# Altium schematic symbol library IC_Maxim.SchLib: 843 symbols (part 4 of 20)
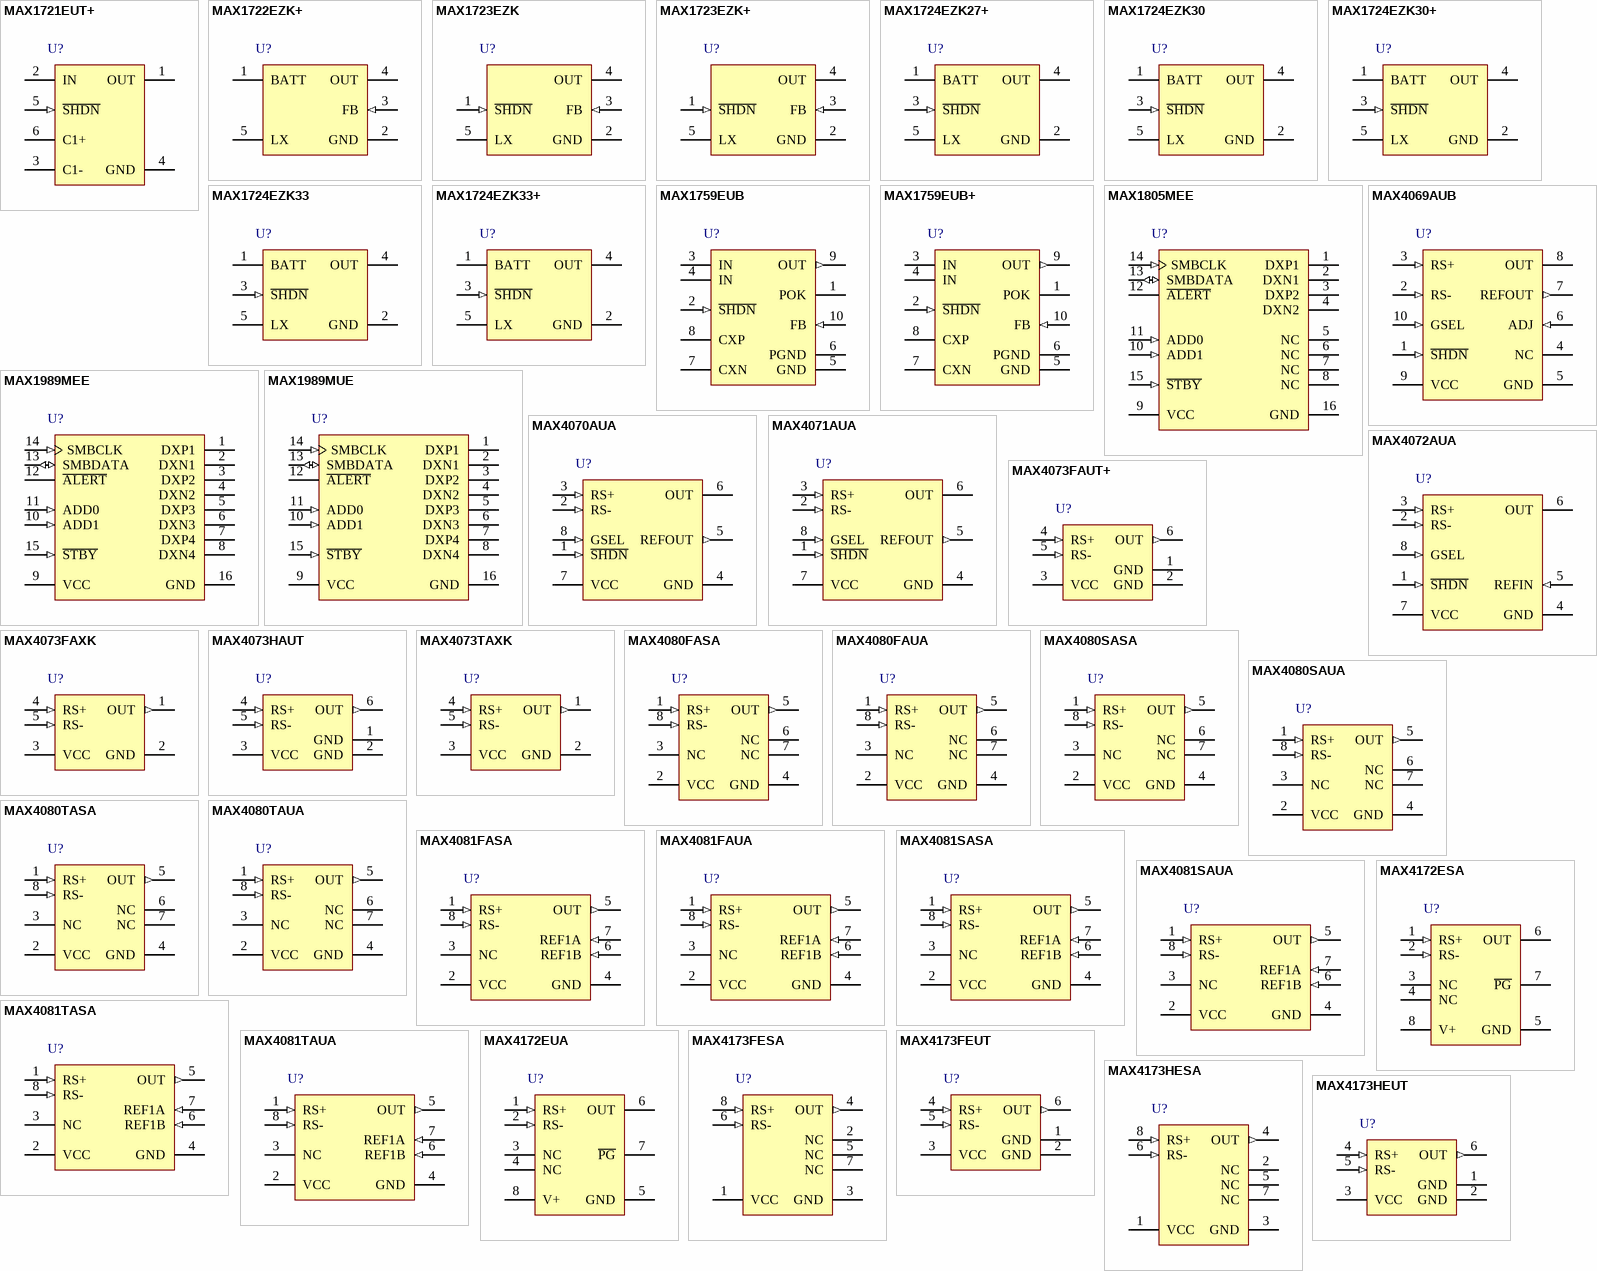
[diagram p27: symbols MAX1721EUT+ to MAX4173HEUT]

## MAX4081SASA
designator U?
76 V, High-Side, Bi-directional Current-Sense Amplifier, 60 V / V Gain, -40 to 125 degC, 8-Pin SOIC (S8-2); PartNumber: MAX4081SASA; Bi-Dir. Curr. Sense: Yes; Gain: 5 V/V, 20 V/V ,60 V/V; Industry Qualified: Automotive - AECQ100, Automotive - General; DatasheetVersion: Rev. 4; PackageVersion: Rev. D, 10/2012; PackageReference: S8-2; PackageDescription: 8-Pin Small-Outline IC, Narrow (0.15in) (S8-2), Body 4.90 x 3.90 mm, Pitch 1.27 mm; Supplier Part Number 1: N/A; Mounting Technology: Surface Mount; Code_JEDEC: MS012; ComponentLink1Description: Manufacturer URL; ComponentLink1URL: http://www.maximintegrated.com/; ComponentLink2Description: Datasheet; ComponentLink2URL: http://datasheets.maximintegrated.com/en/ds/MAX4080-MAX4081.pdf; ComponentLink3Description: Package Specification; ComponentLink3URL: http://pdfserv.maximintegrated.com/package_dwgs/21-0041.PDF
footprint SOIC8_1.27 (Footprint not found)
pins: 1 RS+ (in) "Power connection to the external-sense resistor.", 2 VCC (power) "Supply Voltage Input. Decouple VCC to GND with at least a 0.1uF capacitor to bypass line transients.", 3 NC "No Connection. No internal connection. Leave open or connect to ground.", 4 GND (power) "Ground", 5 OUT (out) "Voltage Output. For the unidirectional MAX4080, VOUT is proportional to VSENSE. For the bidirectional MAX4081, the difference voltage (VOUT - VREF) is proportional to VSENSE and indicates the correct polarity.", 6 REF1B (in) "Reference Voltage Input: Connect REF1B to REF1A or to GND (see the External Reference section).", 7 REF1A (in) "Reference Voltage Input: Connect REF1A and REF1B to a fixed reference voltage (VREF). VOUT is equal to VREF when VSENSE is zero (see the External Reference section).", 8 RS- (in) "Load connection to the external sense resistor."

## MAX4081SAUA
designator U?
76 V, High-Side, Bi-directional Current-Sense Amplifier, 60 V / V Gain, -40 to 125 degC, 8-Pin SOP (U8-1); PartNumber: MAX4081SAUA; Bi-Dir. Curr. Sense: Yes; Gain: 5 V/V, 20 V/V ,60 V/V; Industry Qualified: Automotive - AECQ100, Automotive - General; DatasheetVersion: Rev. 4; PackageVersion: Rev. L, 08/2009; PackageReference: U8-1; PackageDescription: 8-Pin Micro-MAX, Thin Shrink Small-Outline (U8-1), Body 3 x 3 mm, Pitch 0.65mm; Supplier Part Number 1: N/A; Mounting Technology: Surface Mount; Code_JEDEC: MO-187; ComponentLink1Description: Manufacturer URL; ComponentLink1URL: http://www.maximintegrated.com/; ComponentLink2Description: Datasheet; ComponentLink2URL: http://datasheets.maximintegrated.com/en/ds/MAX4080-MAX4081.pdf; ComponentLink3Description: Package Specification; ComponentLink3URL: http://pdfserv.maximintegrated.com/package_dwgs/21-0036.PDF
footprint VSSOP8_0.65 (Footprint not found)
pins: 1 RS+ (in) "Power connection to the external-sense resistor.", 2 VCC (power) "Supply Voltage Input. Decouple VCC to GND with at least a 0.1uF capacitor to bypass line transients.", 3 NC "No Connection. No internal connection. Leave open or connect to ground.", 4 GND (power) "Ground", 5 OUT (out) "Voltage Output. For the unidirectional MAX4080, VOUT is proportional to VSENSE. For the bidirectional MAX4081, the difference voltage (VOUT - VREF) is proportional to VSENSE and indicates the correct polarity.", 6 REF1B (in) "Reference Voltage Input: Connect REF1B to REF1A or to GND (see the External Reference section).", 7 REF1A (in) "Reference Voltage Input: Connect REF1A and REF1B to a fixed reference voltage (VREF). VOUT is equal to VREF when VSENSE is zero (see the External Reference section).", 8 RS- (in) "Load connection to the external sense resistor."

## MAX4081TASA
designator U?
76 V, High-Side, Bi-directional Current-Sense Amplifier, 20 V / V Gain, -40 to 125 degC, 8-Pin SOIC (S8-2); PartNumber: MAX4081TASA; Bi-Dir. Curr. Sense: Yes; Gain: 5 V/V, 20 V/V ,60 V/V; Industry Qualified: Automotive - AECQ100, Automotive - General; DatasheetVersion: Rev. 4; PackageVersion: Rev. D, 10/2012; PackageReference: S8-2; PackageDescription: 8-Pin Small-Outline IC, Narrow (0.15in) (S8-2), Body 4.90 x 3.90 mm, Pitch 1.27 mm; Supplier Part Number 1: N/A; Mounting Technology: Surface Mount; Code_JEDEC: MS012; ComponentLink1Description: Manufacturer URL; ComponentLink1URL: http://www.maximintegrated.com/; ComponentLink2Description: Datasheet; ComponentLink2URL: http://datasheets.maximintegrated.com/en/ds/MAX4080-MAX4081.pdf; ComponentLink3Description: Package Specification; ComponentLink3URL: http://pdfserv.maximintegrated.com/package_dwgs/21-0041.PDF
footprint SOIC8_1.27 (Footprint not found)
pins: 1 RS+ (in) "Power connection to the external-sense resistor.", 2 VCC (power) "Supply Voltage Input. Decouple VCC to GND with at least a 0.1uF capacitor to bypass line transients.", 3 NC "No Connection. No internal connection. Leave open or connect to ground.", 4 GND (power) "Ground", 5 OUT (out) "Voltage Output. For the unidirectional MAX4080, VOUT is proportional to VSENSE. For the bidirectional MAX4081, the difference voltage (VOUT - VREF) is proportional to VSENSE and indicates the correct polarity.", 6 REF1B (in) "Reference Voltage Input: Connect REF1B to REF1A or to GND (see the External Reference section).", 7 REF1A (in) "Reference Voltage Input: Connect REF1A and REF1B to a fixed reference voltage (VREF). VOUT is equal to VREF when VSENSE is zero (see the External Reference section).", 8 RS- (in) "Load connection to the external sense resistor."

## MAX4081TAUA
designator U?
76 V, High-Side, Bi-directional Current-Sense Amplifier, 20 V / V Gain, -40 to 125 degC, 8-Pin SOP (U8-1); PartNumber: MAX4081TAUA; Bi-Dir. Curr. Sense: Yes; Gain: 5 V/V, 20 V/V ,60 V/V; Industry Qualified: Automotive - AECQ100, Automotive - General; DatasheetVersion: Rev. 4; PackageVersion: Rev. L, 08/2009; PackageReference: U8-1; PackageDescription: 8-Pin Micro-MAX, Thin Shrink Small-Outline (U8-1), Body 3 x 3 mm, Pitch 0.65mm; Supplier Part Number 1: MAX4081TAUA-ND; Supplier Part Number 2: 700-MAX4081TAUA-NR; Mounting Technology: Surface Mount; Code_JEDEC: MO-187; ComponentLink1Description: Manufacturer URL; ComponentLink1URL: http://www.maximintegrated.com/; ComponentLink2Description: Datasheet; ComponentLink2URL: http://datasheets.maximintegrated.com/en/ds/MAX4080-MAX4081.pdf; ComponentLink3Description: Package Specification; ComponentLink3URL: http://pdfserv.maximintegrated.com/package_dwgs/21-0036.PDF
footprint VSSOP8_0.65 (Footprint not found)
pins: 1 RS+ (in) "Power connection to the external-sense resistor.", 2 VCC (power) "Supply Voltage Input. Decouple VCC to GND with at least a 0.1uF capacitor to bypass line transients.", 3 NC "No Connection. No internal connection. Leave open or connect to ground.", 4 GND (power) "Ground", 5 OUT (out) "Voltage Output. For the unidirectional MAX4080, VOUT is proportional to VSENSE. For the bidirectional MAX4081, the difference voltage (VOUT - VREF) is proportional to VSENSE and indicates the correct polarity.", 6 REF1B (in) "Reference Voltage Input: Connect REF1B to REF1A or to GND (see the External Reference section).", 7 REF1A (in) "Reference Voltage Input: Connect REF1A and REF1B to a fixed reference voltage (VREF). VOUT is equal to VREF when VSENSE is zero (see the External Reference section).", 8 RS- (in) "Load connection to the external sense resistor."

## MAX4172ESA
designator U?
Precision, High-Side, Current-Sense Amplifier (Iout) 10 uA / mV Gain, -40 to 85 degC, 8-Pin SOIC (S8-4); PartNumber: MAX4172ESA; Bi-Dir. Curr. Sense: No; DatasheetVersion: Rev. 2; PackageVersion: Rev. D, 10/2012; PackageReference: S8-4; PackageDescription: 8-Pin Small-Outline IC, Narrow, Body 3.9 x 4.9 mm, Pitch 1.27 mm; Supplier Part Number 1: MAX4172ESA-ND; Supplier Part Number 2: 700-MAX4172ESA-NR; Gain: 10 uA/mV; Mounting Technology: Surface Mount; Code_JEDEC: MS-012; ComponentLink1Description: Manufacturer URL; ComponentLink1URL: http://www.maximintegrated.com/; ComponentLink2Description: Datasheet; ComponentLink2URL: http://datasheets.maximintegrated.com/en/ds/MAX4172.pdf; ComponentLink3Description: Package Specification; ComponentLink3URL: http://pdfserv.maximintegrated.com/package_dwgs/21-0041.PDF
footprint SOIC8_1.27 (Footprint not found)
pins: 1 RS+ (in) "Power connection to the external sense resistor. The “+” indicates the direction of current flow.", 2 RS- (in) "Load-side connection for the external sense resistor. The “-” indicates the direction of current flow.", 3 NC "No Connect. No internal connection. Leave open or connect to GND", 4 NC "No Connect. No internal connection. Leave open or connect to GND", 5 GND (power) "Ground", 6 OUT (hiz) "Current Output. OUT is proportional to the magnitude of the sense voltage (VRS+ - VRS-). A 1k ohm resistor from OUT to ground will result in a voltage equal to 10V/V of sense voltage.", 7 ~{PG} (oc) "Power Good Open-Collector Logic Output. A low level indicates that V+ is sufficient to power the MAX4172, and adequate time has passed for power-on transients to settle out.", 8 V+ (power) "Supply Voltage Input for the MAX4172"

## MAX4172EUA
designator U?
Precision, High-Side, Current-Sense Amplifier (Iout) 10 uA / mV Gain, -40 to 85 degC, 8-Pin SOP (U8-1); PartNumber: MAX4172EUA; Bi-Dir. Curr. Sense: No; DatasheetVersion: Rev. 2; PackageVersion: Rev. L, 08/2009; PackageReference: U8-1; PackageDescription: 8-Pin Micro-MAX, Thin Shrink Small-Outline (U8-1), Body 3 x 3 mm, Pitch 0.65mm; Supplier Part Number 1: MAX4172EUA-ND; Supplier Part Number 2: 700-MAX4172EUA-NR; Gain: 10 uA/mV; Mounting Technology: Surface Mount; Code_JEDEC: MO-187; ComponentLink1Description: Manufacturer URL; ComponentLink1URL: http://www.maximintegrated.com/; ComponentLink2Description: Datasheet; ComponentLink2URL: http://datasheets.maximintegrated.com/en/ds/MAX4172.pdf; ComponentLink3Description: Package Specification; ComponentLink3URL: http://pdfserv.maximintegrated.com/package_dwgs/21-0036.PDF
footprint VSSOP8_0.65 (Footprint not found)
pins: 1 RS+ (in) "Power connection to the external sense resistor. The “+” indicates the direction of current flow.", 2 RS- (in) "Load-side connection for the external sense resistor. The “-” indicates the direction of current flow.", 3 NC "No Connect. No internal connection. Leave open or connect to GND", 4 NC "No Connect. No internal connection. Leave open or connect to GND", 5 GND (power) "Ground", 6 OUT (hiz) "Current Output. OUT is proportional to the magnitude of the sense voltage (VRS+ - VRS-). A 1k ohm resistor from OUT to ground will result in a voltage equal to 10V/V of sense voltage.", 7 ~{PG} (oc) "Power Good Open-Collector Logic Output. A low level indicates that V+ is sufficient to power the MAX4172, and adequate time has passed for power-on transients to settle out.", 8 V+ (power) "Supply Voltage Input for the MAX4172"

## MAX4173FESA
designator U?
Voltage-Output, High-Side Current-Sense Amplifier, 50 V / V Gain, -40 to 85 degC, 8-Pin SOIC (S8-2); PartNumber: MAX4173FESA; Bi-Dir. Curr. Sense: No; Gain: 20 V/V, 50 V/V ,100 V/V; DatasheetVersion: Rev. 5; PackageVersion: Rev. D, 10/2012; PackageReference: S8-2; PackageDescription: 8-Pin Small-Outline IC, Narrow (0.15in) (S8-2), Body 4.90 x 3.90 mm, Pitch 1.27 mm; Supplier Part Number 1: MAX4173FESA-ND; Supplier Part Number 2: 700-MAX4173FESA-NR; Mounting Technology: Surface Mount; Code_JEDEC: MS012; ComponentLink1Description: Manufacturer URL; ComponentLink1URL: http://www.maximintegrated.com/; ComponentLink2Description: Datasheet; ComponentLink2URL: http://datasheets.maximintegrated.com/en/ds/MAX4173-MAX4173T.pdf; ComponentLink3Description: Package Specification; ComponentLink3URL: http://pdfserv.maximintegrated.com/package_dwgs/21-0041.PDF
footprint SOIC8_1.27 (Footprint not found)
pins: 1 VCC (power) "Supply Voltage. Use at least a 0.1uF capacitor to decouple VCC from fast transients", 2 NC "No Connection. Not internally connected.", 3 GND (power) "Ground", 4 OUT (out) "Output Voltage. VOUT is proportional to the magnitude of VSENSE (VRS+ - VRS-).", 5 NC "No Connection. Not internally connected.", 6 RS- (in) "Load connection to the external sense resistor.", 7 NC "No Connection. Not internally connected.", 8 RS+ (in) "Power connection to the external-sense resistor."

## MAX4173FEUT
designator U?
Voltage-Output, High-Side Current-Sense Amplifier, 50 V / V Gain, -40 to 85 degC, 6-Pin SOT23 (U6-1); PartNumber: MAX4173FEUT; Bi-Dir. Curr. Sense: No; Gain: 20 V/V, 50 V/V ,100 V/V; DatasheetVersion: Rev. 5; PackageVersion: Rev. N, 08/2012; PackageReference: U6-1; PackageDescription: 6-Pin Small-Outline Transistor Package (U6-1), Body 2.9 x 1.625 mm, Pitch 0.95 mm; Supplier Part Number 1: N/A; Mounting Technology: Surface Mount; Code_JEDEC: MO178; ComponentLink1Description: Manufacturer URL; ComponentLink1URL: http://www.maximintegrated.com/; ComponentLink2Description: Datasheet; ComponentLink2URL: http://datasheets.maximintegrated.com/en/ds/MAX4173-MAX4173T.pdf; ComponentLink3Description: Package Specification; ComponentLink3URL: http://pdfserv.maximintegrated.com/package_dwgs/21-0058.PDF
footprint SOT23-6 (Footprint not found)
pins: 1 GND (power) "Ground", 2 GND (power) "Ground", 3 VCC (power) "Supply Voltage Input. Bypass to GND with a 0.1uF capacitor", 4 RS+ (in) "Power-Side Connection to the External Sense Resistor", 5 RS- (in) "Load-Side Connection to the External Sense Resistor", 6 OUT (out) "Voltage Output. VOUT is proportional to VSENSE. Output impedance is approximately 12k ohm."

## MAX4173HESA
designator U?
Voltage-Output, High-Side Current-Sense Amplifier, 100 V / V Gain, -40 to 85 degC, 8-Pin SOIC (S8-2); PartNumber: MAX4173HESA; Bi-Dir. Curr. Sense: No; Gain: 20 V/V, 50 V/V ,100 V/V; DatasheetVersion: Rev. 5; PackageVersion: Rev. D, 10/2012; PackageReference: S8-2; PackageDescription: 8-Pin Small-Outline IC, Narrow (0.15in) (S8-2), Body 4.90 x 3.90 mm, Pitch 1.27 mm; Supplier Part Number 1: MAX4173HESA-ND; Supplier Part Number 2: 700-MAX4173HESA-NR; Mounting Technology: Surface Mount; Code_JEDEC: MS012; ComponentLink1Description: Manufacturer URL; ComponentLink1URL: http://www.maximintegrated.com/; ComponentLink2Description: Datasheet; ComponentLink2URL: http://datasheets.maximintegrated.com/en/ds/MAX4173-MAX4173T.pdf; ComponentLink3Description: Package Specification; ComponentLink3URL: http://pdfserv.maximintegrated.com/package_dwgs/21-0041.PDF
footprint SOIC8_1.27 (Footprint not found)
pins: 1 VCC (power) "Supply Voltage. Use at least a 0.1uF capacitor to decouple VCC from fast transients", 2 NC "No Connection. Not internally connected.", 3 GND (power) "Ground", 4 OUT (out) "Output Voltage. VOUT is proportional to the magnitude of VSENSE (VRS+ - VRS-).", 5 NC "No Connection. Not internally connected.", 6 RS- (in) "Load connection to the external sense resistor.", 7 NC "No Connection. Not internally connected.", 8 RS+ (in) "Power connection to the external-sense resistor."

## MAX4173HEUT
designator U?
Voltage-Output, High-Side Current-Sense Amplifier, 100 V / V Gain, -40 to 85 degC, 6-Pin SOT23 (U6-1); PartNumber: MAX4173HEUT; Bi-Dir. Curr. Sense: No; Gain: 20 V/V, 50 V/V ,100 V/V; DatasheetVersion: Rev. 5; PackageVersion: Rev. N, 08/2012; PackageReference: U6-1; PackageDescription: 6-Pin Small-Outline Transistor Package (U6-1), Body 2.9 x 1.625 mm, Pitch 0.95 mm; Supplier Part Number 1: N/A; Mounting Technology: Surface Mount; Code_JEDEC: MO178; ComponentLink1Description: Manufacturer URL; ComponentLink1URL: http://www.maximintegrated.com/; ComponentLink2Description: Datasheet; ComponentLink2URL: http://datasheets.maximintegrated.com/en/ds/MAX4173-MAX4173T.pdf; ComponentLink3Description: Package Specification; ComponentLink3URL: http://pdfserv.maximintegrated.com/package_dwgs/21-0058.PDF
footprint SOT23-6 (Footprint not found)
pins: 1 GND (power) "Ground", 2 GND (power) "Ground", 3 VCC (power) "Supply Voltage Input. Bypass to GND with a 0.1uF capacitor", 4 RS+ (in) "Power-Side Connection to the External Sense Resistor", 5 RS- (in) "Load-Side Connection to the External Sense Resistor", 6 OUT (out) "Voltage Output. VOUT is proportional to VSENSE. Output impedance is approximately 12k ohm."

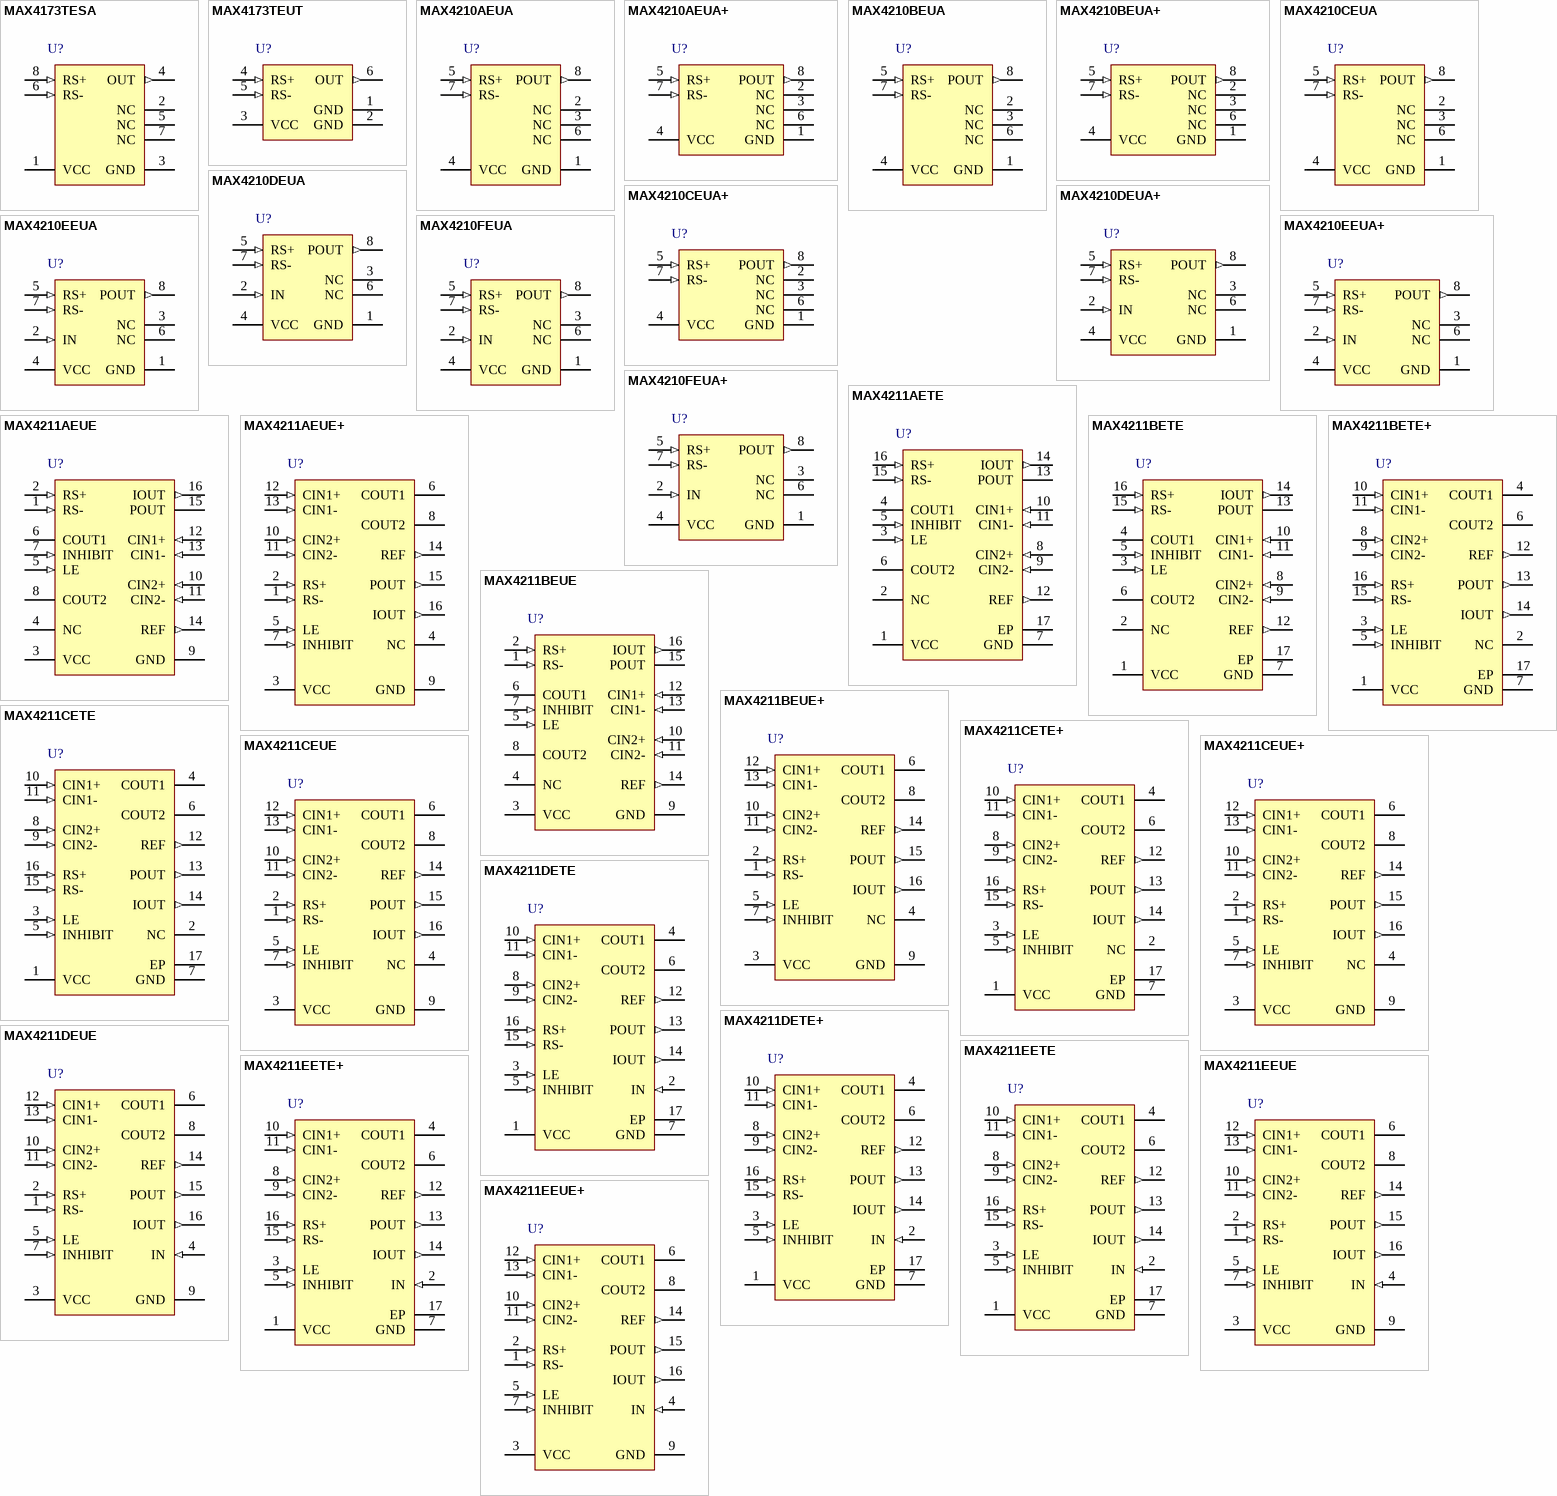
[diagram p4: symbols MAX4173TESA to MAX4211EEUE+]

## MAX4173TESA
designator U?
Voltage-Output, High-Side Current-Sense Amplifier, 20 V / V Gain, -40 to 85 degC, 8-Pin SOIC (S8-2); PartNumber: MAX4173TESA; Bi-Dir. Curr. Sense: No; Gain: 20 V/V, 50 V/V ,100 V/V; DatasheetVersion: Rev. 5; PackageVersion: Rev. D, 10/2012; PackageReference: S8-2; PackageDescription: 8-Pin Small-Outline IC, Narrow (0.15in) (S8-2), Body 4.90 x 3.90 mm, Pitch 1.27 mm; Supplier Part Number 1: MAX4173TESA-ND; Supplier Part Number 2: 700-MAX4173TESA-NR; Mounting Technology: Surface Mount; Code_JEDEC: MS012; ComponentLink1Description: Manufacturer URL; ComponentLink1URL: http://www.maximintegrated.com/; ComponentLink2Description: Datasheet; ComponentLink2URL: http://datasheets.maximintegrated.com/en/ds/MAX4173-MAX4173T.pdf; ComponentLink3Description: Package Specification; ComponentLink3URL: http://pdfserv.maximintegrated.com/package_dwgs/21-0041.PDF
footprint SOIC8_1.27 (Footprint not found)
pins: 1 VCC (power) "Supply Voltage. Use at least a 0.1uF capacitor to decouple VCC from fast transients", 2 NC "No Connection. Not internally connected.", 3 GND (power) "Ground", 4 OUT (out) "Output Voltage. VOUT is proportional to the magnitude of VSENSE (VRS+ - VRS-).", 5 NC "No Connection. Not internally connected.", 6 RS- (in) "Load connection to the external sense resistor.", 7 NC "No Connection. Not internally connected.", 8 RS+ (in) "Power connection to the external-sense resistor."

## MAX4173TEUT
designator U?
Voltage-Output, High-Side Current-Sense Amplifier, 20 V / V Gain, -40 to 85 degC, 6-Pin SOT23 (U6-1); PartNumber: MAX4173TEUT; Bi-Dir. Curr. Sense: No; Gain: 20 V/V, 50 V/V ,100 V/V; DatasheetVersion: Rev. 5; PackageVersion: Rev. N, 08/2012; PackageReference: U6-1; PackageDescription: 6-Pin Small-Outline Transistor Package (U6-1), Body 2.9 x 1.625 mm, Pitch 0.95 mm; Supplier Part Number 1: N/A; Mounting Technology: Surface Mount; Code_JEDEC: MO178; ComponentLink1Description: Manufacturer URL; ComponentLink1URL: http://www.maximintegrated.com/; ComponentLink2Description: Datasheet; ComponentLink2URL: http://datasheets.maximintegrated.com/en/ds/MAX4173-MAX4173T.pdf; ComponentLink3Description: Package Specification; ComponentLink3URL: http://pdfserv.maximintegrated.com/package_dwgs/21-0058.PDF
footprint SOT23-6 (Footprint not found)
pins: 1 GND (power) "Ground", 2 GND (power) "Ground", 3 VCC (power) "Supply Voltage Input. Bypass to GND with a 0.1uF capacitor", 4 RS+ (in) "Power-Side Connection to the External Sense Resistor", 5 RS- (in) "Load-Side Connection to the External Sense Resistor", 6 OUT (out) "Voltage Output. VOUT is proportional to VSENSE. Output impedance is approximately 12k ohm."

## MAX4210AEUA
designator U?
High-Side, Power + Current Monitor, 16.67 V / V Gain, -40 to 85 degC, 8-Pin SOP (U8-1); PartNumber: MAX4210AEUA; Bi-Dir. Curr. Sense: No; Gain: 16.67 V/V, 25 V/V ,40.96 V/V; DatasheetVersion: Rev. 1; PackageVersion: Rev. L, 08/2009; PackageReference: U8-1; PackageDescription: 8-Pin Micro-MAX, Thin Shrink Small-Outline (U8-1), Body 3 x 3 mm, Pitch 0.65mm; Supplier Part Number 1: MAX4210AEUA-ND; Supplier Part Number 2: 700-MAX4210AEUA-NR; Mounting Technology: Surface Mount; Code_JEDEC: MO-187; ComponentLink1Description: Manufacturer URL; ComponentLink1URL: http://www.maximintegrated.com/; ComponentLink2Description: Datasheet; ComponentLink2URL: http://datasheets.maximintegrated.com/en/ds/MAX4210-MAX4211.pdf; ComponentLink3Description: Package Specification; ComponentLink3URL: http://pdfserv.maximintegrated.com/package_dwgs/21-0036.PDF
footprint VSSOP8_0.65 (Footprint not found)
pins: 1 GND (power) "Ground", 2 NC "No Connection. Not internally connected.", 3 NC "No Connection. Not internally connected.", 4 VCC (power) "Power-Supply Voltage. Connect a 0.1uF bypass capacitor from VCC to GND", 5 RS+ (in) "Power Connection to External-Sense Resistor and Internal Resistor-Divider", 6 NC "No Connection. Not internally connected.", 7 RS- (in) "Load-Side Connection for External-Sense Resistor", 8 POUT (out) "Power Output Voltage. Voltage output proportional to source power (input voltage multiplied by load current)."

## MAX4210AEUA+
designator U?
Power Monitor, Internal Resistor-Divider Network, 8-Pin uMAX, -40癈 to +85癈, Pb-Free; DatasheetVersion: Rev 1, May-2005; PackageVersion: revL, 2009; PackageReference: U8+1; PackageDescription: 8-Pin Micro-MAX, Thin Shrink Small-Outline, 0.65 mm Pitch, uMAX, uSOP, Pb-Free; Code_JEDEC: MO-187-AA; ComponentLink1Description: Manufacturer URL; ComponentLink1URL: http://www.maxim-ic.com; ComponentLink2Description: Datasheet; ComponentLink2URL: http://datasheets.maxim-ic.com/en/ds/MAX4210-MAX4211.pdf; ComponentLink3Description: Package Specification; ComponentLink3URL: http://pdfserv.maxim-ic.com/package_dwgs/21-0036.PDF
footprint VSSOP8_0.65 (Footprint not found)
pins: 1 GND (power), 2 NC, 3 NC, 4 VCC (power), 5 RS+ (in), 6 NC, 7 RS- (in), 8 POUT (out)

## MAX4210BEUA
designator U?
High-Side, Power + Current Monitor, 25 V / V Gain, -40 to 85 degC, 8-Pin SOP (U8-1); Generic Part Number: MAX4210; PartNumber: MAX4210BEUA; Bi-Dir. Curr. Sense: No; Gain: 16.67 V/V, 25 V/V ,40.96 V/V; DatasheetVersion: Rev. 1; PackageVersion: Rev. L, 08/2009; PackageReference: U8-1; PackageDescription: 8-Pin Micro-MAX, Thin Shrink Small-Outline (U8-1), Body 3 x 3 mm, Pitch 0.65mm; Supplier Part Number 1: MAX4210BEUA-ND; Supplier Part Number 2: 700-MAX4210BEUA-NR; Mounting Technology: Surface Mount; Code_JEDEC: MO-187; ComponentLink1Description: Manufacturer URL; ComponentLink1URL: http://www.maximintegrated.com/; ComponentLink2Description: Datasheet; ComponentLink2URL: http://datasheets.maximintegrated.com/en/ds/MAX4210-MAX4211.pdf; ComponentLink3Description: Package Specification; ComponentLink3URL: http://pdfserv.maximintegrated.com/package_dwgs/21-0036.PDF
footprint VSSOP8_0.65 (Footprint not found)
pins: 1 GND (power) "Ground", 2 NC "No Connection. Not internally connected.", 3 NC "No Connection. Not internally connected.", 4 VCC (power) "Power-Supply Voltage. Connect a 0.1uF bypass capacitor from VCC to GND", 5 RS+ (in) "Power Connection to External-Sense Resistor and Internal Resistor-Divider", 6 NC "No Connection. Not internally connected.", 7 RS- (in) "Load-Side Connection for External-Sense Resistor", 8 POUT (out) "Power Output Voltage. Voltage output proportional to source power (input voltage multiplied by load current)."

## MAX4210BEUA+
designator U?
Power Monitor, Internal Resistor-Divider Network, 8-Pin uMAX, -40癈 to +85癈, Pb-Free; DatasheetVersion: Rev 1, May-2005; PackageVersion: revL, 2009; PackageReference: U8+1; PackageDescription: 8-Pin Micro-MAX, Thin Shrink Small-Outline, 0.65 mm Pitch, uMAX, uSOP, Pb-Free; Code_JEDEC: MO-187-AA; ComponentLink1Description: Manufacturer URL; ComponentLink1URL: http://www.maxim-ic.com; ComponentLink2Description: Datasheet; ComponentLink2URL: http://datasheets.maxim-ic.com/en/ds/MAX4210-MAX4211.pdf; ComponentLink3Description: Package Specification; ComponentLink3URL: http://pdfserv.maxim-ic.com/package_dwgs/21-0036.PDF
footprint VSSOP8_0.65 (Footprint not found)
pins: 1 GND (power), 2 NC, 3 NC, 4 VCC (power), 5 RS+ (in), 6 NC, 7 RS- (in), 8 POUT (out)

## MAX4210CEUA
designator U?
High-Side, Power + Current Monitor, 40.96 V / V Gain, -40 to 85 degC, 8-Pin SOP (U8-1); Generic Part Number: MAX4210; PartNumber: MAX4210CEUA; Bi-Dir. Curr. Sense: No; Gain: 16.67 V/V, 25 V/V ,40.96 V/V; DatasheetVersion: Rev. 1; PackageVersion: Rev. L, 08/2009; PackageReference: U8-1; PackageDescription: 8-Pin Micro-MAX, Thin Shrink Small-Outline (U8-1), Body 3 x 3 mm, Pitch 0.65mm; Supplier Part Number 1: MAX4210CEUA-ND; Supplier Part Number 2: 700-MAX4210CEUA-NR; Mounting Technology: Surface Mount; Code_JEDEC: MO-187; ComponentLink1Description: Manufacturer URL; ComponentLink1URL: http://www.maximintegrated.com/; ComponentLink2Description: Datasheet; ComponentLink2URL: http://datasheets.maximintegrated.com/en/ds/MAX4210-MAX4211.pdf; ComponentLink3Description: Package Specification; ComponentLink3URL: http://pdfserv.maximintegrated.com/package_dwgs/21-0036.PDF
footprint VSSOP8_0.65 (Footprint not found)
pins: 1 GND (power) "Ground", 2 NC "No Connection. Not internally connected.", 3 NC "No Connection. Not internally connected.", 4 VCC (power) "Power-Supply Voltage. Connect a 0.1uF bypass capacitor from VCC to GND", 5 RS+ (in) "Power Connection to External-Sense Resistor and Internal Resistor-Divider", 6 NC "No Connection. Not internally connected.", 7 RS- (in) "Load-Side Connection for External-Sense Resistor", 8 POUT (out) "Power Output Voltage. Voltage output proportional to source power (input voltage multiplied by load current)."

## MAX4210CEUA+
designator U?
Power Monitor, Internal Resistor-Divider Network, 8-Pin uMAX, -40癈 to +85癈, Pb-Free; DatasheetVersion: Rev 1, May-2005; PackageVersion: revL, 2009; PackageReference: U8+1; PackageDescription: 8-Pin Micro-MAX, Thin Shrink Small-Outline, 0.65 mm Pitch, uMAX, uSOP, Pb-Free; Code_JEDEC: MO-187-AA; ComponentLink1Description: Manufacturer URL; ComponentLink1URL: http://www.maxim-ic.com; ComponentLink2Description: Datasheet; ComponentLink2URL: http://datasheets.maxim-ic.com/en/ds/MAX4210-MAX4211.pdf; ComponentLink3Description: Package Specification; ComponentLink3URL: http://pdfserv.maxim-ic.com/package_dwgs/21-0036.PDF
footprint VSSOP8_0.65 (Footprint not found)
pins: 1 GND (power), 2 NC, 3 NC, 4 VCC (power), 5 RS+ (in), 6 NC, 7 RS- (in), 8 POUT (out)

## MAX4210DEUA
designator U?
High-Side, Power + Current Monitor, 16.67 V / V Gain, -40 to 85 degC, 8-Pin SOP (U8-1); Generic Part Number: MAX4210; PartNumber: MAX4210DEUA; Bi-Dir. Curr. Sense: No; Gain: 16.67 V/V, 25 V/V ,40.96 V/V; DatasheetVersion: Rev. 1; PackageVersion: Rev. L, 08/2009; PackageReference: U8-1; PackageDescription: 8-Pin Micro-MAX, Thin Shrink Small-Outline (U8-1), Body 3 x 3 mm, Pitch 0.65mm; Supplier Part Number 1: MAX4210DEUA-ND; Supplier Part Number 2: 700-MAX4210DEUA-NR; Mounting Technology: Surface Mount; Code_JEDEC: MO-187; ComponentLink1Description: Manufacturer URL; ComponentLink1URL: http://www.maximintegrated.com/; ComponentLink2Description: Datasheet; ComponentLink2URL: http://datasheets.maximintegrated.com/en/ds/MAX4210-MAX4211.pdf; ComponentLink3Description: Package Specification; ComponentLink3URL: http://pdfserv.maximintegrated.com/package_dwgs/21-0036.PDF
footprint VSSOP8_0.65 (Footprint not found)
pins: 1 GND (power) "Ground", 2 IN (in) "Multiplier Input Voltage. Voltage input for internal multiplier.", 3 NC "No Connection. Not internally connected.", 4 VCC (power) "Power-Supply Voltage. Connect a 0.1uF bypass capacitor from VCC to GND.", 5 RS+ (in) "Power Connection to External-Sense Resistor", 6 NC "No Connection. Not internally connected.", 7 RS- (in) "Load-Side Connection for External-Sense Resistor", 8 POUT (out) "Power Output Voltage. Voltage output proportional to source power (input voltage multiplied by load current)."

## MAX4210DEUA+
designator U?
Power Monitor, External Resistor-Divider Network, 8-Pin uMAX, -40癈 to +85癈, Pb-Free; DatasheetVersion: Rev 1, May-2005; PackageVersion: revL, 2009; PackageReference: U8+1; PackageDescription: 8-Pin Micro-MAX, Thin Shrink Small-Outline, 0.65 mm Pitch, uMAX, uSOP, Pb-Free; Code_JEDEC: MO-187-AA; ComponentLink1Description: Manufacturer URL; ComponentLink1URL: http://www.maxim-ic.com; ComponentLink2Description: Datasheet; ComponentLink2URL: http://datasheets.maxim-ic.com/en/ds/MAX4210-MAX4211.pdf; ComponentLink3Description: Package Specification; ComponentLink3URL: http://pdfserv.maxim-ic.com/package_dwgs/21-0036.PDF
footprint VSSOP8_0.65 (Footprint not found)
pins: 1 GND (power), 2 IN (in), 3 NC, 4 VCC (power), 5 RS+ (in), 6 NC, 7 RS- (in), 8 POUT (out)

## MAX4210EEUA
designator U?
High-Side, Power + Current Monitor, 25 V / V Gain, -40 to 85 degC, 8-Pin SOP (U8-1); Generic Part Number: MAX4210; PartNumber: MAX4210EEUA; Bi-Dir. Curr. Sense: No; Gain: 16.67 V/V, 25 V/V ,40.96 V/V; DatasheetVersion: Rev. 1; PackageVersion: Rev. L, 08/2009; PackageReference: U8-1; PackageDescription: 8-Pin Micro-MAX, Thin Shrink Small-Outline (U8-1), Body 3 x 3 mm, Pitch 0.65mm; Supplier Part Number 1: MAX4210EEUA-ND; Supplier Part Number 2: 700-MAX4210EEUA-NR; Mounting Technology: Surface Mount; Code_JEDEC: MO-187; ComponentLink1Description: Manufacturer URL; ComponentLink1URL: http://www.maximintegrated.com/; ComponentLink2Description: Datasheet; ComponentLink2URL: http://datasheets.maximintegrated.com/en/ds/MAX4210-MAX4211.pdf; ComponentLink3Description: Package Specification; ComponentLink3URL: http://pdfserv.maximintegrated.com/package_dwgs/21-0036.PDF
footprint VSSOP8_0.65 (Footprint not found)
pins: 1 GND (power) "Ground", 2 IN (in) "Multiplier Input Voltage. Voltage input for internal multiplier.", 3 NC "No Connection. Not internally connected.", 4 VCC (power) "Power-Supply Voltage. Connect a 0.1uF bypass capacitor from VCC to GND.", 5 RS+ (in) "Power Connection to External-Sense Resistor", 6 NC "No Connection. Not internally connected.", 7 RS- (in) "Load-Side Connection for External-Sense Resistor", 8 POUT (out) "Power Output Voltage. Voltage output proportional to source power (input voltage multiplied by load current)."

## MAX4210EEUA+
designator U?
Power Monitor, External Resistor-Divider Network, 8-Pin uMAX, -40癈 to +85癈, Pb-Free; DatasheetVersion: Rev 1, May-2005; PackageVersion: revL, 2009; PackageReference: U8+1; PackageDescription: 8-Pin Micro-MAX, Thin Shrink Small-Outline, 0.65 mm Pitch, uMAX, uSOP, Pb-Free; Code_JEDEC: MO-187-AA; ComponentLink1Description: Manufacturer URL; ComponentLink1URL: http://www.maxim-ic.com; ComponentLink2Description: Datasheet; ComponentLink2URL: http://datasheets.maxim-ic.com/en/ds/MAX4210-MAX4211.pdf; ComponentLink3Description: Package Specification; ComponentLink3URL: http://pdfserv.maxim-ic.com/package_dwgs/21-0036.PDF
footprint VSSOP8_0.65 (Footprint not found)
pins: 1 GND (power), 2 IN (in), 3 NC, 4 VCC (power), 5 RS+ (in), 6 NC, 7 RS- (in), 8 POUT (out)

## MAX4210FEUA
designator U?
High-Side, Power + Current Monitor, 40.96 V / V Gain, -40 to 85 degC, 8-Pin SOP (U8-1); Generic Part Number: MAX4210; PartNumber: MAX4210FEUA; Bi-Dir. Curr. Sense: No; Gain: 16.67 V/V, 25 V/V, 40.96 V/V; DatasheetVersion: Rev. 1; PackageVersion: Rev. L, 08/2009; PackageReference: U8-1; PackageDescription: 8-Pin Micro-MAX, Thin Shrink Small-Outline (U8-1), Body 3 x 3 mm, Pitch 0.65mm; Supplier Part Number 1: MAX4210FEUA-ND; Supplier Part Number 2: 700-MAX4210FEUA-NR; Mounting Technology: Surface Mount; Code_JEDEC: MO-187; ComponentLink1Description: Manufacturer URL; ComponentLink1URL: http://www.maximintegrated.com/; ComponentLink2Description: Datasheet; ComponentLink2URL: http://datasheets.maximintegrated.com/en/ds/MAX4210-MAX4211.pdf; ComponentLink3Description: Package Specification; ComponentLink3URL: http://pdfserv.maximintegrated.com/package_dwgs/21-0036.PDF
footprint VSSOP8_0.65 (Footprint not found)
pins: 1 GND (power) "Ground", 2 IN (in) "Multiplier Input Voltage. Voltage input for internal multiplier.", 3 NC "No Connection. Not internally connected.", 4 VCC (power) "Power-Supply Voltage. Connect a 0.1uF bypass capacitor from VCC to GND.", 5 RS+ (in) "Power Connection to External-Sense Resistor", 6 NC "No Connection. Not internally connected.", 7 RS- (in) "Load-Side Connection for External-Sense Resistor", 8 POUT (out) "Power Output Voltage. Voltage output proportional to source power (input voltage multiplied by load current)."

## MAX4210FEUA+
designator U?
Power Monitor, External Resistor-Divider Network, 8-Pin uMAX, -40癈 to +85癈, Pb-Free; DatasheetVersion: Rev 1, May-2005; PackageVersion: revL, 2009; PackageReference: U8+1; PackageDescription: 8-Pin Micro-MAX, Thin Shrink Small-Outline, 0.65 mm Pitch, uMAX, uSOP, Pb-Free; Code_JEDEC: MO-187-AA; ComponentLink1Description: Manufacturer URL; ComponentLink1URL: http://www.maxim-ic.com; ComponentLink2Description: Datasheet; ComponentLink2URL: http://datasheets.maxim-ic.com/en/ds/MAX4210-MAX4211.pdf; ComponentLink3Description: Package Specification; ComponentLink3URL: http://pdfserv.maxim-ic.com/package_dwgs/21-0036.PDF
footprint VSSOP8_0.65 (Footprint not found)
pins: 1 GND (power), 2 IN (in), 3 NC, 4 VCC (power), 5 RS+ (in), 6 NC, 7 RS- (in), 8 POUT (out)

## MAX4211AETE
designator U?
High-Side, Power + Current Monitor with 2 Comparators + Reference, 16.67 V / V Gain, -40 to 85 degC, 16-Pin QFN (T1644-4); PartNumber: MAX4211AETE; Bi-Dir. Curr. Sense: No; Gain: 16.67 V/V, 25 V/V ,40.96 V/V; DatasheetVersion: Rev. 1; PackageVersion: Rev. L, 04/2012; PackageReference: T1644-4; PackageDescription: 16-Pin Thin Quad Flatpack, No Leads (T1644-4), Body 4 x 4 mm, Pitch 0.65 mm; Supplier Part Number 1: MAX4211AETE-ND; Supplier Part Number 2: 700-MAX4211AETE-; Mounting Technology: Surface Mount; Code_JEDEC: MO220; ComponentLink1Description: Manufacturer URL; ComponentLink1URL: http://www.maximintegrated.com/; ComponentLink2Description: Datasheet; ComponentLink2URL: http://datasheets.maximintegrated.com/en/ds/MAX4210-MAX4211.pdf; ComponentLink3Description: Package Specification; ComponentLink3URL: http://pdfserv.maximintegrated.com/package_dwgs/21-0139.PDF
footprint QFN16_0.65-PAD(4x4) (Footprint not found)
pins: 1 VCC (power) "Power-Supply Voltage. Connect a 0.1礔 bypass capacitor from VCC to GND.", 2 NC "No Connection. Not internally connected.", 3 LE (in) "Latch Enable for Comparator 1. Driving logic low makes the comparator transparent (regular comparator). Driving logic high latches the output.", 4 COUT1 (oc) "Open- Drain Comparator 1 Output. LE  and  INHIBIT control  the comparator 1 output.", 5 INHIBIT (in) "INHIBIT for Comparator 1 Output. Driving logic high inhibits the comparator operation. Drive logic low for normal operation.", 6 COUT2 (oc) "Open-Drain Comparator 2 Output", 7 GND (power) "Ground", 8 CIN2+ (in) "Comparator 2 Positive Input", 9 CIN2- (in) "Comparator 2 Negative Input", 10 CIN1+ (in) "Comparator 1 Positive Input", 11 CIN1- (in) "Comparator 1 Negative Input", 12 REF (out) "1.21V Internal Reference Output", 13 POUT (power) "Power Output Voltage. Voltage output proportional to source power (input voltage multiplied by load current).", 14 IOUT (out) "Current Output Voltage. Voltage output proportional to VSENSE (VRS+ - VRS-) load current.", 15 RS- (in) "Load-Side Connection for External-Sense Resistor", 16 RS+ (in) "Power Connection to External-Sense Resistor and Internal Resistor-Divider", 17 EP (power) "Exposed Paddle. EP is internally connected to GND."

## MAX4211AEUE
designator U?
High-Side, Power and Current Monitor with 2 Comparators and Reference, 16.67 V / V Gain, -40 to 85 degC, 16-Pin SOP (U16-2); PartNumber: MAX4211AEUE; Bi-Dir. Curr. Sense: No; Gain: 16.67 V/V, 25 V/V ,40.96 V/V; DatasheetVersion: Rev. 1; PackageVersion: Rev. L, 07/2010; PackageReference: U16-2; PackageDescription: 16-Pin Thin Shrink Small-Outline Package, Body 4.4 x 5 mm, Pitch 0.65 mm; Supplier Part Number 1: MAX4211AEUE-ND; Supplier Part Number 2: 700-MAX4211AEUE-NR; Mounting Technology: Surface Mount; Code_JEDEC: MO-153; ComponentLink1Description: Manufacturer URL; ComponentLink1URL: http://www.maximintegrated.com/; ComponentLink2Description: Datasheet; ComponentLink2URL: http://datasheets.maximintegrated.com/en/ds/MAX4210-MAX4211.pdf; ComponentLink3Description: Package Specification; ComponentLink3URL: http://pdfserv.maximintegrated.com/package_dwgs/21-0066.PDF
footprint TSSOP16_0.65 (Footprint not found)
pins: 1 RS- (in) "Load-Side Connection for External-Sense Resistor", 2 RS+ (in) "Power Connection to External-Sense Resistor and Internal Resistor-Divider", 3 VCC (power) "Power-Supply Voltage. Connect a 0.1礔 bypass capacitor from VCC to GND.", 4 NC "No Connection. Not internally connected.", 5 LE (in) "Latch Enable for Comparator 1. Driving logic low makes the comparator transparent (regular comparator). Driving logic high latches the output.", 6 COUT1 (oc) "Open- Drain Comparator 1 Output. LE  and  INHIBIT control  the comparator 1 output.", 7 INHIBIT (in) "INHIBIT for Comparator 1 Output. Driving logic high inhibits the comparator operation. Drive logic low for normal operation.", 8 COUT2 (oc) "Open-Drain Comparator 2 Output", 9 GND (power) "Ground", 10 CIN2+ (in) "Comparator 2 Positive Input", 11 CIN2- (in) "Comparator 2 Negative Input", 12 CIN1+ (in) "Comparator 1 Positive Input", 13 CIN1- (in) "Comparator 1 Negative Input", 14 REF (out) "1.21V Internal Reference Output", 15 POUT (power) "Power Output Voltage. Voltage output proportional to source power (input voltage multiplied by load current).", 16 IOUT (out) "Current Output Voltage. Voltage output proportional to VSENSE (VRS+ - VRS-) load current."

## MAX4211AEUE+
designator U?
High-Side Power Monitor, Open-Drain Outputs, 16-Pin TSSOP, -40癈 to +85癈, Pb-Free; DatasheetVersion: Rev 1, May-2005; PackageVersion: revL, 2010; PackageReference: U16+2; PackageDescription: 16-Pin Thin Shrink Small-Outline Package, 4.4 mm Body, TSSOP, Pb-Free; Code_JEDEC: MO-153-AB; ComponentLink1Description: Manufacturer URL; ComponentLink1URL: http://www.maxim-ic.com; ComponentLink2Description: Datasheet; ComponentLink2URL: http://datasheets.maxim-ic.com/en/ds/MAX4210-MAX4211.pdf; ComponentLink3Description: Package Specification; ComponentLink3URL: http://pdfserv.maxim-ic.com/package_dwgs/21-0066.PDF
footprint TSSOP16_0.65 (Footprint not found)
pins: 1 RS- (in), 2 RS+ (in), 3 VCC (power), 4 NC, 5 LE (in), 6 COUT1 (oc), 7 INHIBIT (in), 8 COUT2 (oc), 9 GND (power), 10 CIN2+ (in), 11 CIN2- (in), 12 CIN1+ (in), 13 CIN1- (in), 14 REF (out), 15 POUT (out), 16 IOUT (out)

## MAX4211BETE
designator U?
High-Side, Power + Current Monitor with 2 Comparators + Reference, 25 V / V Gain, -40 to 85 degC, 16-Pin QFN (T1644-4); PartNumber: MAX4211BETE; Bi-Dir. Curr. Sense: No; Gain: 16.67 V/V, 25 V/V ,40.96 V/V; DatasheetVersion: Rev. 1; PackageVersion: Rev. L, 04/2012; PackageReference: T1644-4; PackageDescription: 16-Pin Thin Quad Flatpack, No Leads (T1644-4), Body 4 x 4 mm, Pitch 0.65 mm; Supplier Part Number 1: MAX4211BETE-ND; Supplier Part Number 2: 700-MAX4211BETE-; Mounting Technology: Surface Mount; Code_JEDEC: MO220; ComponentLink1Description: Manufacturer URL; ComponentLink1URL: http://www.maximintegrated.com/; ComponentLink2Description: Datasheet; ComponentLink2URL: http://datasheets.maximintegrated.com/en/ds/MAX4210-MAX4211.pdf; ComponentLink3Description: Package Specification; ComponentLink3URL: http://pdfserv.maximintegrated.com/package_dwgs/21-0139.PDF
footprint QFN16_0.65-PAD(4x4) (Footprint not found)
pins: 1 VCC (power) "Power-Supply Voltage. Connect a 0.1礔 bypass capacitor from VCC to GND.", 2 NC "No Connection. Not internally connected.", 3 LE (in) "Latch Enable for Comparator 1. Driving logic low makes the comparator transparent (regular comparator). Driving logic high latches the output.", 4 COUT1 (oc) "Open- Drain Comparator 1 Output. LE  and  INHIBIT control  the comparator 1 output.", 5 INHIBIT (in) "INHIBIT for Comparator 1 Output. Driving logic high inhibits the comparator operation. Drive logic low for normal operation.", 6 COUT2 (oc) "Open-Drain Comparator 2 Output", 7 GND (power) "Ground", 8 CIN2+ (in) "Comparator 2 Positive Input", 9 CIN2- (in) "Comparator 2 Negative Input", 10 CIN1+ (in) "Comparator 1 Positive Input", 11 CIN1- (in) "Comparator 1 Negative Input", 12 REF (out) "1.21V Internal Reference Output", 13 POUT (power) "Power Output Voltage. Voltage output proportional to source power (input voltage multiplied by load current).", 14 IOUT (out) "Current Output Voltage. Voltage output proportional to VSENSE (VRS+ - VRS-) load current.", 15 RS- (in) "Load-Side Connection for External-Sense Resistor", 16 RS+ (in) "Power Connection to External-Sense Resistor and Internal Resistor-Divider", 17 EP (power) "Exposed Paddle. EP is internally connected to GND."